# Altium footprint library USB_PD_PSU.PcbLib: 47 footprints (part 2 of 3)
Each footprint in its own frame and in the unit in brackets; x right, y up, seen from the top. Pads: shape width x height; smd on the part's side, far side on the other; paste and mask are expansions set on the pad; w line width, h text height; cw(c..) or ccw(c..) is an arc to the next point about the centre after c.
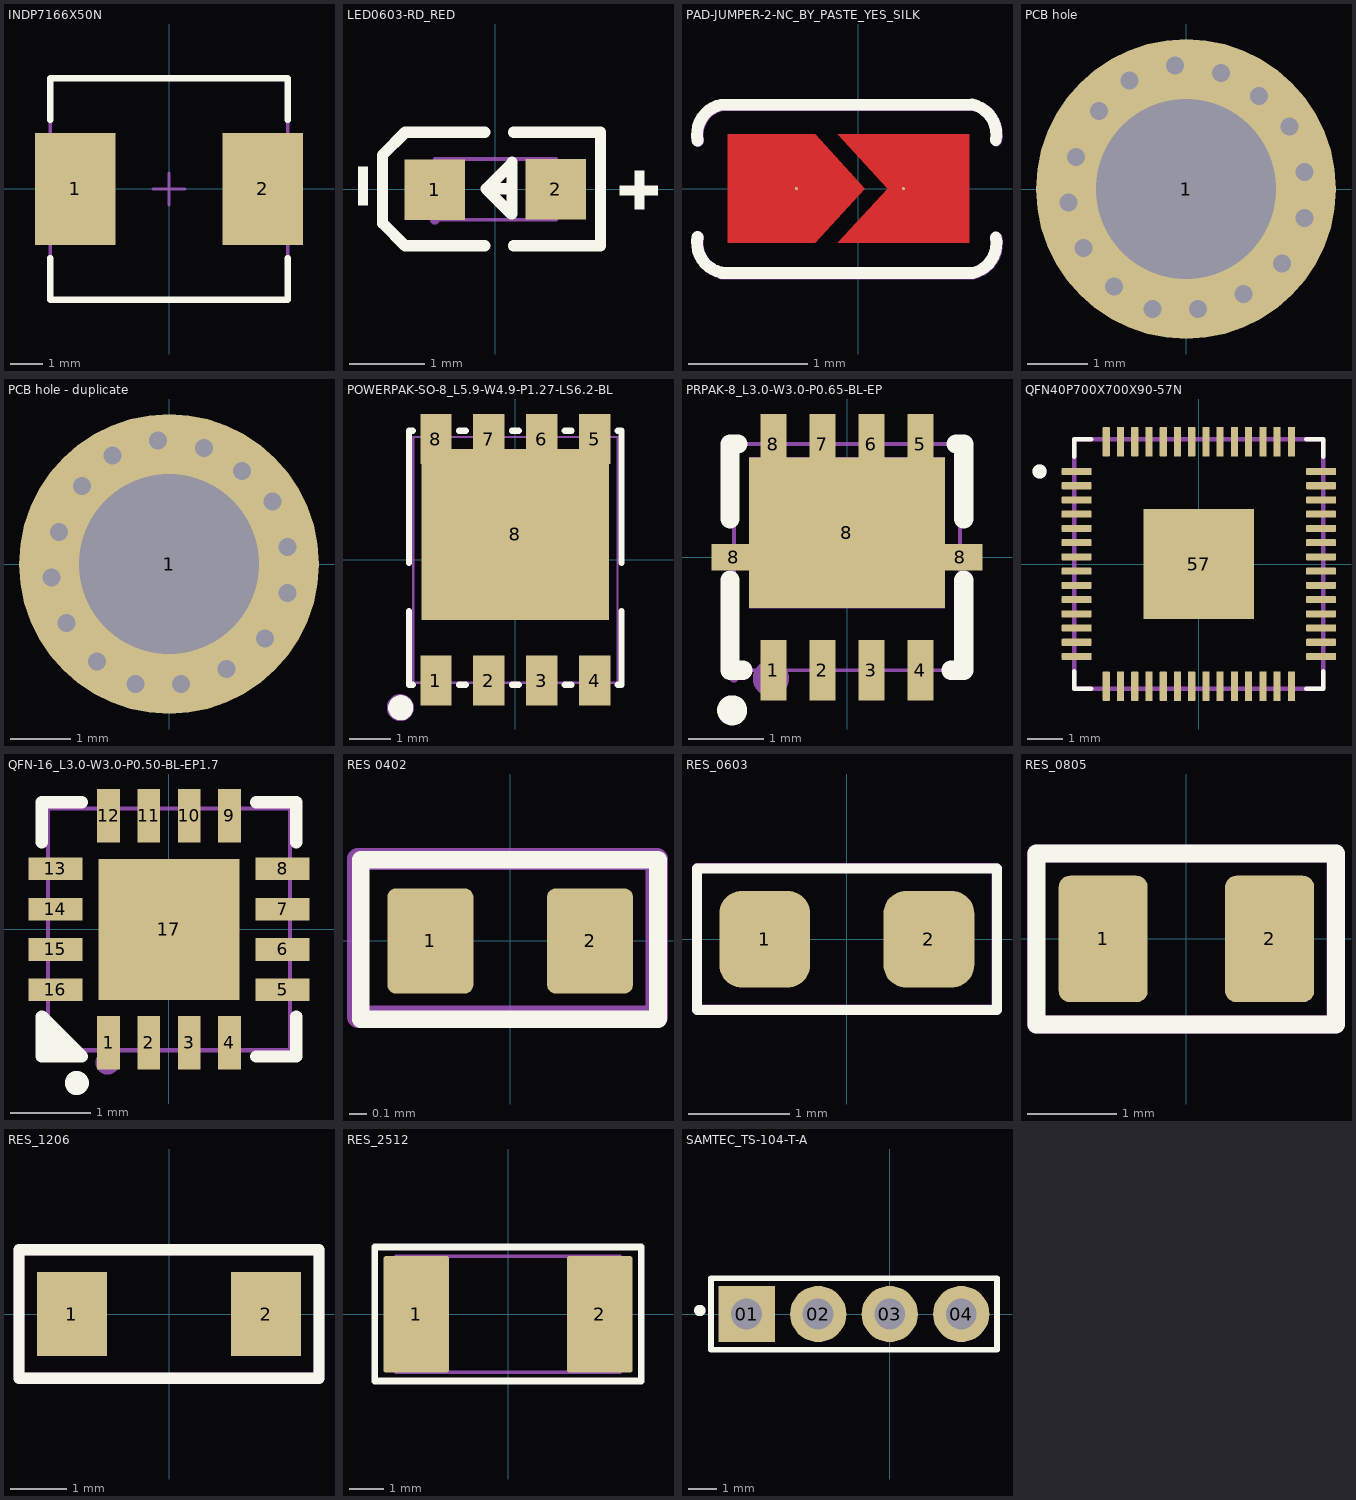
[diagram p1: the footprints below, top view; thin cyan lines are the x and y axes]

## INDP7166X50N [mm] "Precision Wire Wound Inductor, 2-Leads, Body 7.10x6.60mm, IPC Medium Density"
height 5
pads (2):
  rect 2.5x3.5 smd: 1(-2.925,0) 2(2.925,0)
Top Overlay:
  lines w0.2: -3.7,-2.15 -3.7,-3.45 3.7,-3.45 3.7,-2.15 ; -3.7,2.15 -3.7,3.45 3.7,3.45 3.7,2.15
Top Assembly:
  lines w0.1: -0.5,0 0.5,0 ; 0,-0.5 0,0.5 ; -3.7,-3.45 3.7,-3.45 3.7,3.45 -3.7,3.45 -3.7,-3.45
  text ".Designator" at -2.251,2.115 h1
3D body "INDP7166X50N.step": height 5.1, standoff 0, extent -3.65,-3.3 3.65,3.3

## LED0603-RD_RED [mm]
pads (2):
  rect 0.8x0.8 smd paste+0 mask+0.051: 1(-0.8,-0.003) 2(0.8,0.003)
Top Overlay:
  region: -1.814,-0.208 -1.814,0.3 -1.687,0.3 -1.687,-0.208
  region: 1.642,0.05 2.15,0.05 2.15,-0.077 1.642,-0.077
  region: 1.84,-0.263 1.84,0.245 1.967,0.245 1.967,-0.263
  lines w0.15: -0.14,-0.746 -1.19,-0.746 -1.49,-0.446 -1.49,-0.346 -1.49,0.354 -1.49,0.454 -1.19,0.754 -0.14,0.754 ; 0.22,0.007 -0.12,0.007 ; 0.24,-0.744 1.39,-0.744 ; 0.24,0.757 1.39,0.757 1.39,-0.723 ; -0.12,0.007 0.21,-0.323 0.22,-0.323 0.22,0.357 0.22,0.347 -0.12,0.007
Top Assembly:
  region: 0.5,-0.396 0.5,0.404 0.8,0.404 0.8,-0.396
  region: -0.8,-0.403 -0.8,0.397 -0.5,0.397 -0.5,-0.403
  region: -0.74,-0.403 -0.741,-0.379 -0.775,-0.346 -0.824,-0.346 -0.858,-0.379 -0.859,-0.403 -0.858,-0.428 -0.824,-0.461 -0.775,-0.461 -0.741,-0.428 -0.74,-0.403
  lines w0.051: -0.8,-0.4 0.8,-0.4 0.8,0.4 -0.8,0.4 -0.8,-0.4
  text "'.Designator'" at -0.762,-0.127 h0.5
Mechanical 6:
  region: 0.529,0.068 1.069,0.068 1.069,-0.062 0.529,-0.062
  region: 0.735,-0.267 0.735,0.273 0.865,0.273 0.865,-0.267
  region: -1.07,0.062 -0.53,0.062 -0.53,-0.068 -1.07,-0.068
3D body "LED_0603 v4.step": height 0.63, standoff 0.06, extent -0.823,-0.403 0.797,0.397

## PAD-JUMPER-2-NC_BY_PASTE_YES_SILK [mil]
pads (2):
  round 1 smd mask+4: 1(-20.53,0.09) 2(14.97,0.09)
Top Layer:
  region: -6.78,18.09 36.72,18.09 36.72,-17.91 -6.78,-17.91 9.72,0.09
  region: -14.28,-17.91 -43.28,-17.91 -43.28,18.09 -14.28,18.09 2.22,0.09
Top Overlay:
  lines w3.94: -53.28,-15.91 ccw(c-43.44,-17.88) -45.4,-27.72 ; -53.28,16.09 cw(c-43.44,18.07) -45.4,27.91 37.69,27.91 ; -45.4,-27.91 37.72,-27.91 ccw(c35.76,-18.07) 45.6,-16.09 ; 37.69,28 cw(c35.73,18.16) 45.56,16.19
Top Paste:
  region: -23.81,17.81 -40.71,17.81 -42.71,15.84 -42.71,6.87 -42.71,-6.13 -42.71,-15.65 -40.71,-17.62 -23.81,-17.62 -21.84,-15.65 -21.84,15.84
  region: 34.47,17.81 17.57,17.81 15.57,15.84 15.57,6.87 15.57,-6.12 15.57,-15.65 17.57,-17.62 34.47,-17.62 36.44,-15.65 36.44,15.84
Top Solder:
  region: -6.84,18.06 36.66,18.06 36.66,-17.94 -6.84,-17.94 9.66,0.06
  region: -14.26,-17.93 -43.26,-17.93 -43.26,18.07 -14.26,18.07 2.24,0.07
Top Assembly:
  lines w3.94: -53.08,-16.08 ccw(c-43.24,-18.05) -45.2,-27.89 ; -53.08,15.92 cw(c-43.24,17.89) -45.2,27.73 37.89,27.73 ; -45.2,-28.08 37.92,-28.08 ccw(c35.96,-18.24) 45.8,-16.27 ; 37.89,27.83 cw(c35.93,17.99) 45.76,16.02
  text ".Designator" at -40,-12.57 h39.37

## PCB hole [mm]
pads (1):
  round 5 hole 3: 1(0,0)
via -0.943,1.807 diameter 0.6 hole 0.3
via -1.451,1.299 diameter 0.6 hole 0.3
via -1.832,0.537 diameter 0.6 hole 0.3
via -1.959,-0.225 diameter 0.6 hole 0.3
via -1.705,-0.987 diameter 0.6 hole 0.3
via -1.197,-1.622 diameter 0.6 hole 0.3
via -0.562,-2.003 diameter 0.6 hole 0.3
via 0.2,-2.003 diameter 0.6 hole 0.3
via 0.962,-1.749 diameter 0.6 hole 0.3
via 1.597,-1.241 diameter 0.6 hole 0.3
via 1.978,-0.479 diameter 0.6 hole 0.3
via 1.978,0.283 diameter 0.6 hole 0.3
via 1.724,1.045 diameter 0.6 hole 0.3
via 1.216,1.553 diameter 0.6 hole 0.3
via 0.581,1.934 diameter 0.6 hole 0.3
via -0.181,2.061 diameter 0.6 hole 0.3

## PCB hole - duplicate [mm]
pads (1):
  round 5 hole 3: 1(0,0)
via -0.181,2.061 diameter 0.6 hole 0.3
via 0.581,1.934 diameter 0.6 hole 0.3
via 1.216,1.553 diameter 0.6 hole 0.3
via 1.724,1.045 diameter 0.6 hole 0.3
via 1.978,0.283 diameter 0.6 hole 0.3
via 1.978,-0.479 diameter 0.6 hole 0.3
via 1.597,-1.241 diameter 0.6 hole 0.3
via 0.962,-1.749 diameter 0.6 hole 0.3
via 0.2,-2.003 diameter 0.6 hole 0.3
via -0.562,-2.003 diameter 0.6 hole 0.3
via -1.197,-1.622 diameter 0.6 hole 0.3
via -1.705,-0.987 diameter 0.6 hole 0.3
via -1.959,-0.225 diameter 0.6 hole 0.3
via -1.832,0.537 diameter 0.6 hole 0.3
via -1.451,1.299 diameter 0.6 hole 0.3
via -0.943,1.807 diameter 0.6 hole 0.3

## PCBComponent_1 [mm]

## POWERPAK-SO-8_L5.9-W4.9-P1.27-LS6.2-BL [mm]
pads (9):
  rect 0.75x1.2 smd paste-100 mask+0.05: 1(-1.905,-2.9) 2(-0.635,-2.9) 3(0.635,-2.9) 4(1.905,-2.9) 5(1.905,2.9) 6(0.635,2.9) 7(-0.635,2.9) 8(-1.905,2.9)
  rect 4.5x4.1 smd paste-100 mask+0.05: 8(0,0.609)
Top Overlay:
  circle w0.3: c-2.75,-3.55 r0.15
  lines w0.152: -2.55,-1.236 -2.55,-3 -2.46,-3 ; -2.55,-0.076 -2.55,3.1 -2.46,3.1 ; -1.35,-3 -1.19,-3 ; -1.35,3.1 -1.19,3.1 ; -0.08,-3 0.08,-3 ; -0.08,3.1 0.08,3.1 ; 1.19,-3 1.35,-3 ; 1.19,3.1 1.35,3.1 ; 2.46,-3 2.55,-3 2.55,-1.236 ; 2.46,3.1 2.55,3.1 2.55,-0.076
Top Paste:
  region: -2.28,-2.3 -1.53,-2.3 -1.53,-3.5 -2.28,-3.5
  region: -1.01,-2.3 -0.26,-2.3 -0.26,-3.5 -1.01,-3.5
  region: 0.26,-2.3 1.01,-2.3 1.01,-3.5 0.26,-3.5
  region: 1.53,-2.3 2.28,-2.3 2.28,-3.5 1.53,-3.5
  region: 1.53,3.5 1.53,2.659 1.01,2.659 1.01,3.5 0.26,3.5 0.26,2.659 -0.26,2.659 -0.26,3.5 -1.01,3.5 -1.01,2.659 -1.53,2.659 -1.53,3.5 -2.28,3.5 -2.28,2.3 -2.25,2.3 -2.25,-1.441 2.25,-1.441 2.25,2.3 2.28,2.3 2.28,3.5
Top Assembly:
  circle w0.4: c-2.76,-3.548 r0.125
  region: -2.11,3.08 -1.7,3.08 -1.7,2.47 -2.11,2.47
  region: 0.43,-2.47 0.84,-2.47 0.84,-3.08 0.43,-3.08
  region: 1.7,3.08 2.11,3.08 2.11,2.47 1.7,2.47
  region: -0.84,-2.47 -0.43,-2.47 -0.43,-3.08 -0.84,-3.08
  region: -2.11,-2.47 -1.7,-2.47 -1.7,-3.08 -2.11,-3.08
  region: 0.43,3.08 0.84,3.08 0.84,2.47 0.43,2.47
  region: -0.84,3.08 -0.43,3.08 -0.43,2.47 -0.84,2.47
  region: -2,2.472 2,2.472 2,-1.228 -2,-1.228
  region: 1.7,-2.47 2.11,-2.47 2.11,-3.08 1.7,-3.08
  lines w0.051: -2.45,-2.95 2.45,-2.95 2.45,2.95 -2.45,2.95 -2.45,-2.95
  text ".Designator" at -2.348,3.878 h1
3D body "SIR182DP-T1-RE3.STEP": height 1.12, standoff 0, extent -2.556,-2.961 2.601,3.186

## PRPAK-8_L3.0-W3.0-P0.65-BL-EP [mm]
pads (11):
  rect 0.35x0.8 smd paste-100 mask+0.051: 1(-0.975,-1.5) 2(-0.325,-1.5) 3(0.325,-1.5) 4(0.975,-1.5) 5(0.975,1.5) 6(0.325,1.5) 7(-0.325,1.5) 8(-0.975,1.5)
  rect 0.6x0.35 smd paste-100 mask+0.051: 8(-1.5,0) 8(1.5,0)
  rect 2.6x2 smd paste-100 mask+0.051: 8(0,0.325)
Top Overlay:
  circle w0.3: c-1.524,-2.032 r0.049
  lines w0.254: -1.55,-0.306 -1.55,-1.5 -1.382,-1.5 ; -1.55,0.506 -1.55,1.5 -1.45,1.5 ; 1.381,-1.5 1.55,-1.5 1.55,-0.306 ; 1.449,1.5 1.55,1.5 1.55,0.506
Top Paste:
  region: -1.15,-1.1 -0.8,-1.1 -0.8,-1.9 -1.15,-1.9
  region: -0.5,-1.1 -0.15,-1.1 -0.15,-1.9 -0.5,-1.9
  region: 0.15,-1.1 0.5,-1.1 0.5,-1.9 0.15,-1.9
  region: 0.8,-1.1 1.15,-1.1 1.15,-1.9 0.8,-1.9
  region: -0.8,1.325 -0.8,1.9 -1.15,1.9 -1.15,1.325 -1.3,1.325 -1.3,0.175 -1.8,0.175 -1.8,-0.175 -1.3,-0.175 -1.3,-0.675 1.3,-0.675 1.3,-0.175 1.8,-0.175 1.8,0.175 1.3,0.175 1.3,1.325 1.15,1.325 1.15,1.9 0.8,1.9 0.8,1.325 0.5,1.325 0.5,1.9 0.15,1.9 0.15,1.325 -0.15,1.325 -0.15,1.9 -0.5,1.9 -0.5,1.325
Top Assembly:
  circle w0.24: c-1.01,-1.61 r0.12
  region: -1.44,-1.6 -1.44,-1.625 -1.475,-1.66 -1.525,-1.66 -1.56,-1.625 -1.56,-1.6 -1.56,-1.575 -1.525,-1.54 -1.475,-1.54 -1.44,-1.575 -1.44,-1.6
  region: 0.175,-1.2 0.475,-1.2 0.475,-1.6 0.175,-1.6
  region: -0.175,1.2 -0.475,1.2 -0.475,1.6 -0.175,1.6
  region: -0.825,1.2 -1.125,1.2 -1.125,1.6 -0.825,1.6
  region: -1.3,1.325 1.3,1.325 1.3,-0.675 -1.3,-0.675
  region: 0.825,-1.2 1.125,-1.2 1.125,-1.6 0.825,-1.6
  region: 0.475,1.2 0.175,1.2 0.175,1.6 0.475,1.6
  region: 1.125,1.2 0.825,1.2 0.825,1.6 1.125,1.6
  region: -0.475,-1.2 -0.175,-1.2 -0.175,-1.6 -0.475,-1.6
  region: -1.126,-1.2 -0.826,-1.2 -0.826,-1.6 -1.126,-1.6
  region: 1.1,-0.15 1.1,0.15 1.5,0.15 1.5,-0.15
  region: -1.1,0.15 -1.1,-0.15 -1.5,-0.15 -1.5,0.15
  lines w0.051: -1.5,-1.5 1.5,-1.5 1.5,1.5 -1.5,1.5 -1.5,-1.5
  text ".Designator" at 0,0.189 h1
3D body "DFN-8 3x3.step": height 1, standoff 0, extent -1.5,-1.525 1.5,1.525

## QFN40P700X700X90-57N [mm]
height 0.9
pads (57):
  rrect25% 0.84x0.2 smd: 1(-3.435,2.6) 2(-3.435,2.2) 3(-3.435,1.8) 4(-3.435,1.4) 5(-3.435,1) 6(-3.435,0.6) 7(-3.435,0.2) 8(-3.435,-0.2) 9(-3.435,-0.6) 10(-3.435,-1) 11(-3.435,-1.4) 12(-3.435,-1.8) 13(-3.435,-2.2) 14(-3.435,-2.6) 29(3.435,-2.6) 30(3.435,-2.2) 31(3.435,-1.8) 32(3.435,-1.4) 33(3.435,-1) 34(3.435,-0.6) 35(3.435,-0.2) 36(3.435,0.2) 37(3.435,0.6) 38(3.435,1) 39(3.435,1.4) 40(3.435,1.8) 41(3.435,2.2) 42(3.435,2.6)
  rrect25% 0.2x0.84 smd: 15(-2.6,-3.435) 16(-2.2,-3.435) 17(-1.8,-3.435) 18(-1.4,-3.435) 19(-1,-3.435) 20(-0.6,-3.435) 21(-0.2,-3.435) 22(0.2,-3.435) 23(0.6,-3.435) 24(1,-3.435) 25(1.4,-3.435) 26(1.8,-3.435) 27(2.2,-3.435) 28(2.6,-3.435) 43(2.6,3.435) 44(2.2,3.435) 45(1.8,3.435) 46(1.4,3.435) 47(1,3.435) 48(0.6,3.435) 49(0.2,3.435) 50(-0.2,3.435) 51(-0.6,3.435) 52(-1,3.435) 53(-1.4,3.435) 54(-1.8,3.435) 55(-2.2,3.435) 56(-2.6,3.435)
  rect 3.1x3.1 smd paste-0.57: 57(0,0)
Top Overlay:
  circle w0.2: c-4.475,2.6 r0.1
  lines w0.127: -3.5,-3.02 -3.5,-3.5 -3.02,-3.5 ; -3.5,3.02 -3.5,3.5 -3.02,3.5 ; 3.02,-3.5 3.5,-3.5 3.5,-3.02 ; 3.02,3.5 3.5,3.5 3.5,3.02
Top Assembly:
  circle w0.2: c-4.472,2.597 r0.1
  lines w0.127: -3.5,-3.5 3.5,-3.5 3.5,3.5 -3.5,3.5 -3.5,-3.5
  text ".Designator" at -2.603,2.054 h1
3D body "step_temp.STEP": height 0.9, standoff 0, extent -3.5,-3.5 3.5,3.5

## QFN-16_L3.0-W3.0-P0.50-BL-EP1.7 [mm]
pads (17):
  rect 0.28x0.665 smd paste-100 mask+0.051: 1(-0.75,-1.407) 2(-0.25,-1.407) 3(0.25,-1.407) 4(0.75,-1.407) 9(0.75,1.407) 10(0.25,1.407) 11(-0.25,1.407) 12(-0.75,1.407)
  rect 0.665x0.28 smd paste-100 mask+0.051: 5(1.407,-0.75) 6(1.407,-0.25) 7(1.407,0.25) 8(1.407,0.75) 13(-1.407,0.75) 14(-1.407,0.25) 15(-1.407,-0.25) 16(-1.407,-0.75)
  rect 1.75x1.75 smd paste-100 mask+0.051: 17(0,0)
Top Overlay:
  circle w0.15: c-1.143,-1.905 r0.075
  region: -1.524,-1.576 -1.524,-1.143 -1.143,-1.576
  lines w0.152: -1.576,1.08 -1.576,1.576 -1.08,1.576 ; 1.08,-1.576 1.576,-1.576 1.576,-1.08 ; 1.08,1.576 1.576,1.576 1.576,1.08 ; -1.576,-1.576 -1.576,-1.08 -1.08,-1.576 -1.576,-1.576
Top Paste:
  region: -0.7,0.7 0.7,0.7 0.7,-0.7 -0.7,-0.7
  region: -0.89,-1.74 -0.89,-1.075 -0.61,-1.075 -0.61,-1.74
  region: -0.39,-1.74 -0.39,-1.075 -0.11,-1.075 -0.11,-1.74
  region: 0.11,-1.74 0.11,-1.075 0.39,-1.075 0.39,-1.74
  region: 0.61,-1.74 0.61,-1.075 0.89,-1.075 0.89,-1.74
  region: 1.74,-0.89 1.74,-0.61 1.075,-0.61 1.075,-0.89
  region: 1.74,-0.39 1.74,-0.11 1.075,-0.11 1.075,-0.39
  region: 1.74,0.11 1.74,0.39 1.075,0.39 1.075,0.11
  region: 1.74,0.61 1.74,0.89 1.075,0.89 1.075,0.61
  region: 0.61,1.74 0.61,1.075 0.89,1.075 0.89,1.74
  region: 0.11,1.74 0.11,1.075 0.39,1.075 0.39,1.74
  region: -0.39,1.74 -0.39,1.075 -0.11,1.075 -0.11,1.74
  region: -0.89,1.74 -0.89,1.075 -0.61,1.075 -0.61,1.74
  region: -1.075,0.61 -1.075,0.89 -1.74,0.89 -1.74,0.61
  region: -1.075,0.11 -1.075,0.39 -1.74,0.39 -1.74,0.11
  region: -1.075,-0.39 -1.075,-0.11 -1.74,-0.11 -1.74,-0.39
  region: -1.075,-0.89 -1.075,-0.61 -1.74,-0.61 -1.74,-0.89
Top Assembly:
  circle w0.15: c-0.762,-1.651 r0.075
  region: -0.85,0.85 0.85,0.85 0.85,-0.85 -0.85,-0.85
  region: -0.853,1.5 -0.853,1.1 -0.647,1.1 -0.647,1.5
  region: -0.853,-1.5 -0.853,-1.1 -0.647,-1.1 -0.647,-1.5
  region: 1.1,0.147 1.1,0.353 1.5,0.353 1.5,0.147
  region: -0.353,-1.5 -0.353,-1.1 -0.147,-1.1 -0.147,-1.5
  region: 1.1,0.647 1.1,0.853 1.5,0.853 1.5,0.647
  region: -1.1,0.647 -1.1,0.853 -1.5,0.853 -1.5,0.647
  region: 0.147,-1.5 0.147,-1.1 0.353,-1.1 0.353,-1.5
  region: -1.1,0.147 -1.1,0.353 -1.5,0.353 -1.5,0.147
  region: 0.647,1.5 0.647,1.1 0.853,1.1 0.853,1.5
  region: 0.647,-1.5 0.647,-1.1 0.853,-1.1 0.853,-1.5
  region: 0.147,1.5 0.147,1.1 0.353,1.1 0.353,1.5
  region: -1.1,-0.353 -1.1,-0.147 -1.5,-0.147 -1.5,-0.353
  region: -1.44,-1.5 -1.44,-1.525 -1.475,-1.56 -1.525,-1.56 -1.56,-1.525 -1.56,-1.5 -1.56,-1.475 -1.525,-1.44 -1.475,-1.44 -1.44,-1.475 -1.44,-1.5
  region: 1.1,-0.853 1.1,-0.647 1.5,-0.647 1.5,-0.853
  region: -1.1,-0.853 -1.1,-0.647 -1.5,-0.647 -1.5,-0.853
  region: 1.1,-0.353 1.1,-0.147 1.5,-0.147 1.5,-0.353
  region: -0.353,1.5 -0.353,1.1 -0.147,1.1 -0.147,1.5
  lines w0.051: -1.5,-1.5 1.5,-1.5 1.5,1.5 -1.5,1.5 -1.5,-1.5
  text ".Designator" at -2.778,1.977 h1
3D body "QFN-16 (3x3).stp": height 0.94, standoff 0.08, extent -1.5,-1.5 1.5,1.5

## RES 0402 [mm]
pads (2):
  rrect20% 0.49x0.6 smd: 1(-0.455,0) 2(0.455,0)
Top Overlay:
  lines w0.1: -0.851,-0.446 -0.851,0.462 0.842,0.462 0.842,-0.446 -0.851,-0.446
Top Assembly:
  lines w0.127: -0.868,-0.432 -0.868,0.468 0.835,0.468 0.835,-0.432 -0.868,-0.432
  text ".Designator" at -0.879,-0.307 h1
3D body "2-1879459-5.stp": height 0.36, standoff 0.04, extent -0.5,-0.25 0.5,0.25

## RES_0603 [mm]
pads (2):
  rrect50% 0.9x0.96 smd mask+0.102: 1(-0.814,0) 2(0.814,0)
Top Overlay:
  lines w0.1: -1.486,-0.701 1.489,-0.701 1.489,0.703 -1.486,0.703 -1.486,-0.701
Top Assembly:
  lines w0.1: -1.486,-0.698 -1.486,0.704 1.486,0.704 1.486,-0.698 -1.486,-0.698
  text ".Designator" at -1.249,-0.278 h1
3D body "User Library-User Library-0603_Res1-1.step": height 0.8, standoff 0, extent -1.232,-0.413 1.228,0.387

## RES_0805 [mm]
pads (2):
  rrect25% 1x1.42 smd: 1(-0.935,0) 2(0.935,0)
Top Overlay:
  lines w0.2: -1.685,-0.962 -1.685,0.958 1.681,0.958 1.681,-0.962 -1.685,-0.962
Top Assembly:
  lines w0.2: -1.69,-0.96 1.676,-0.96 1.676,0.96 -1.69,0.96 -1.69,-0.96
  text ".Designator" at -1.789,-0.187 h1
3D body "User Library-RES0805-2.x_b": height 0.55, standoff 0, extent -0.993,-0.58 1.007,0.67

## RES_1206 [mm]
pads (2):
  rect 1.25x1.5 smd: 1(-1.725,0) 2(1.725,0)
Top Overlay:
  lines w0.2: -2.667,-1.143 2.667,-1.143 2.667,1.143 -1.778,1.143 -2.667,1.143 -2.667,-1.143
Top Assembly:
  lines w0.2: -2.667,-1.143 -2.667,1.143 -1.778,1.143 2.667,1.143 2.667,-1.143 -2.667,-1.143
  text ".Designator" at -2.255,-0.298 h1
3D body "Resistor 1206.step": height 0.6, standoff 0, extent -1.876,-0.778 1.924,0.822

## RES_2512 [mm]
pads (2):
  rrect7% 1.9x3.37 smd: 1(-2.66,0) 2(2.66,0)
Top Overlay:
  lines w0.2: -3.86,-1.931 -3.86,1.949 3.86,1.949 3.86,-1.931 -3.86,-1.931
Top Assembly:
  lines w0.1: -3.25,-1.68 -3.25,1.68 3.25,1.68 3.25,-1.68 -3.25,-1.68
  text ".Designator" at -1.755,-0.198 h1
3D body "2-2176070-7.stp": height 0.53, standoff -0.03, extent -3.277,-1.6 3.023,1.6

## SAMTEC_TS-104-T-A [mm]
pads (4):
  rect 2x2 hole 1.1: 01(-5.08,0)
  round 2 hole 1.1: 02(-2.54,0) 03(0,0) 04(2.54,0)
Top Overlay:
  circle w0.2: c-6.746,0.127 r0.1
  lines w0.2: -6.35,-1.27 3.81,-1.27 3.81,1.27 -6.35,1.27 -6.35,-1.27
Top Assembly:
  circle w0.2: c-6.746,0.127 r0.1
  lines w0.1: -6.35,-1.27 3.81,-1.27 ; -6.35,-1.27 -6.35,1.27 ; -6.35,-1.27 -6.35,1.27 ; -6.35,1.27 3.81,1.27 ; -6.35,1.27 3.81,1.27 ; 3.81,-1.27 3.81,1.27 ; 3.81,-1.27 3.81,1.27
  text ".Designator" at -2.53,-0.147 h1